# Altium footprint library ICs.PcbLib: 163 footprints (part 6 of 11)
Each footprint in its own frame and in the unit in brackets; x right, y up, seen from the top. Pads: shape width x height; smd on the part's side, far side on the other; paste and mask are expansions set on the pad; w line width, h text height; cw(c..) or ccw(c..) is an arc to the next point about the centre after c.
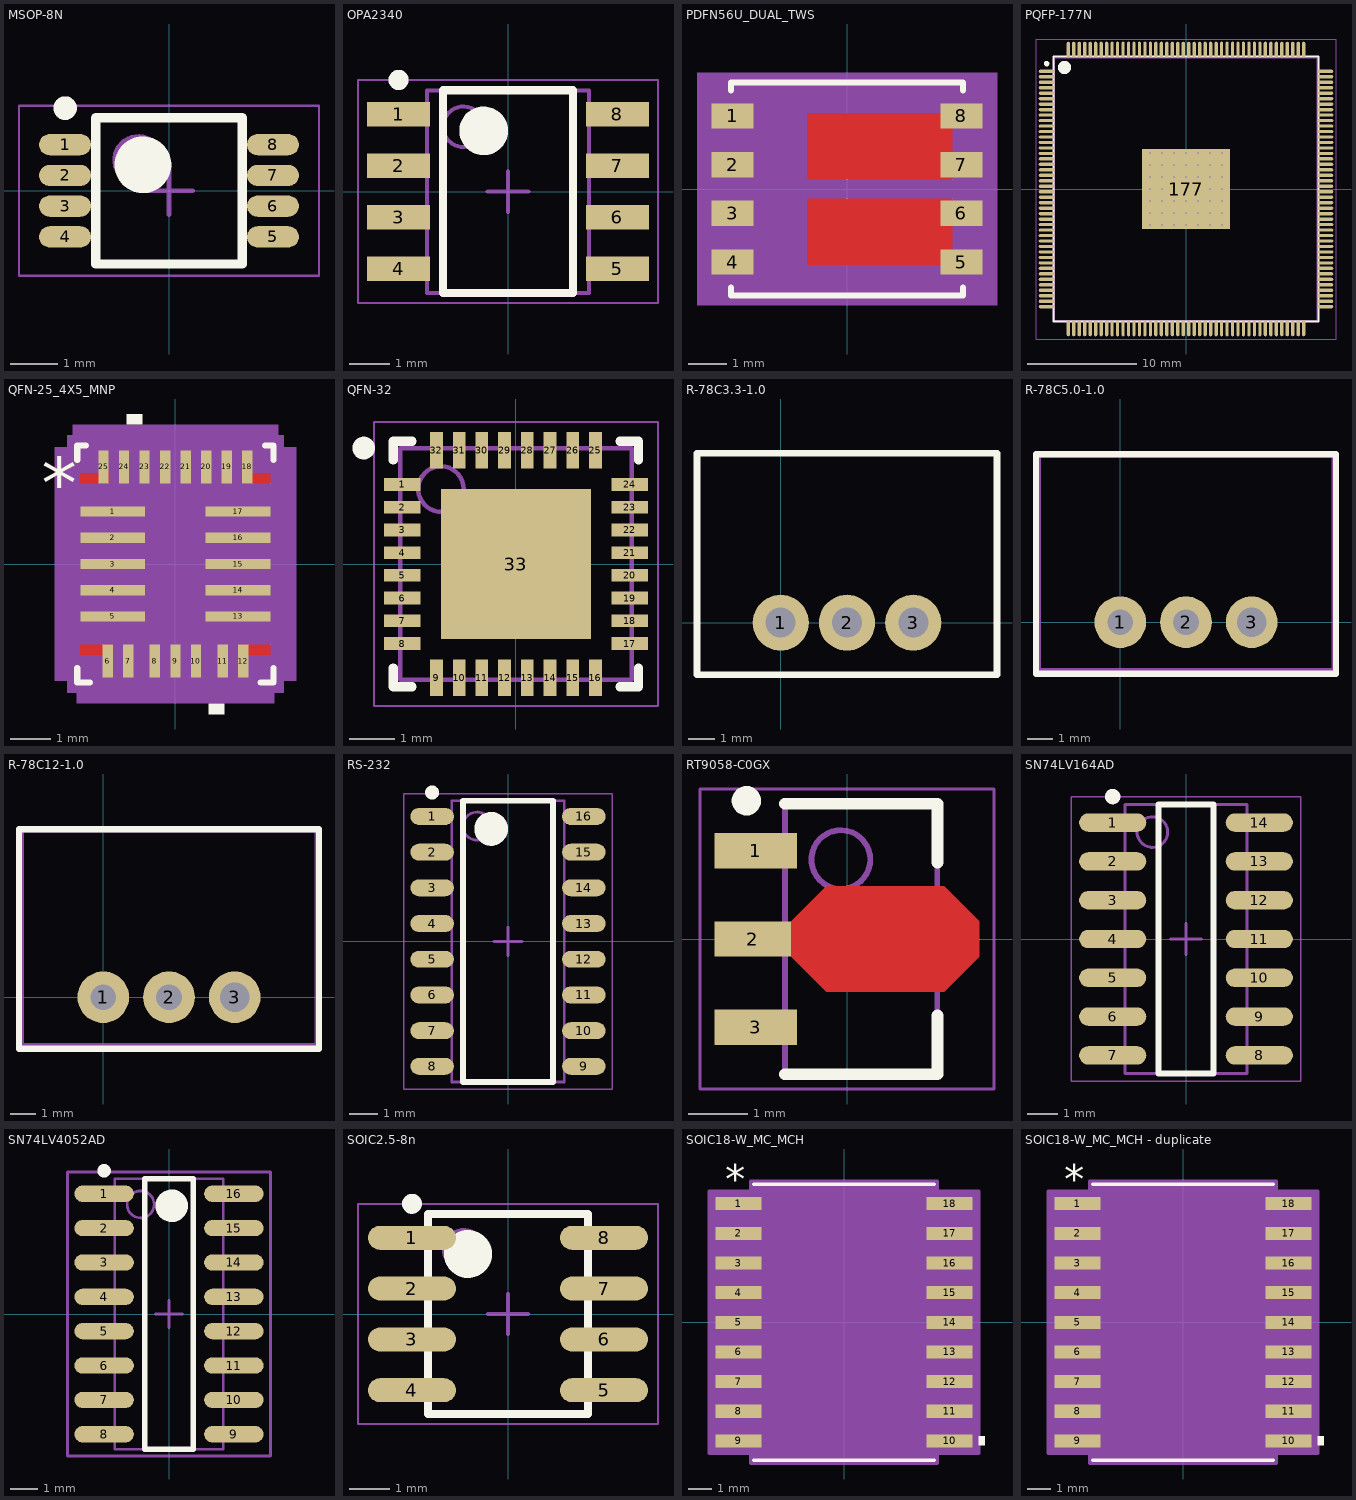
[diagram p5: the footprints below, top view; thin cyan lines are the x and y axes]

## MSOP-8N [mm] "LT1767"
height 1.1
pads (8):
  oval 1.1x0.45 smd: 1(-2.2,0.975) 2(-2.2,0.325) 3(-2.2,-0.325) 4(-2.2,-0.975) 5(2.2,-0.975) 6(2.2,-0.325) 7(2.2,0.325) 8(2.2,0.975)
Top Overlay:
  circle w0.25: c-2.2,1.75 r0.125
  circle w0.6: c-0.55,0.55 r0.3
  lines w0.2: -1.55,-1.55 -1.55,1.55 1.55,1.55 1.55,-1.55 -1.55,-1.55
Mechanical 13:
  circle w0.1: c-0.65,0.65 r0.5
  lines w0.1: -1.55,-1.55 -1.55,1.55 1.55,1.55 1.55,-1.55 -1.55,-1.55
Mechanical 15:
  lines w0.05: -3.175,-1.8 -3.175,1.8 3.175,1.8 3.175,-1.8 -3.175,-1.8
  lines w0.1: -0.5,0 0.5,0 ; 0,-0.5 0,0.5
3D body: height 1.1, standoff 0.1, extent -1.55,-1.55 1.55,1.55

## OPA2340 [mm] "SOIC, 8-Leads, Body 4.90x3.90mm, Pitch 1.27mm, IPC Medium Density"
height 1.75
pads (8):
  rect 1.55x0.6 smd: 1(-2.7,1.905) 2(-2.7,0.635) 3(-2.7,-0.635) 4(-2.7,-1.905) 5(2.7,-1.905) 6(2.7,-0.635) 7(2.7,0.635) 8(2.7,1.905)
Top Overlay:
  circle w0.25: c-2.7,2.755 r0.125
  circle w0.6: c-0.6,1.5 r0.3
  lines w0.2: -1.6,-2.5 -1.6,2.5 1.6,2.5 1.6,-2.5 -1.6,-2.5
Mechanical 13:
  circle w0.1: c-1.1,1.6 r0.5
  lines w0.1: -2,-2.5 -2,2.5 2,2.5 2,-2.5 -2,-2.5
Mechanical 15:
  lines w0.05: -3.7,-2.75 -3.7,2.75 3.7,2.75 3.7,-2.75 -3.7,-2.75
  lines w0.1: -0.5,0 0.5,0 ; 0,-0.5 0,0.5
3D body: height 1.75, standoff 0.25, extent -2,-2.5 2,2.5

## PDFN56U_DUAL_TWS [mil]
pads (8):
  rect 43x26 smd paste+0 mask+0: 1(-117.5,75) 2(-117.5,25) 3(-117.5,-25) 4(-117.5,-75) 5(117.5,-75) 6(117.5,-25) 7(117.5,25) 8(117.5,75)
Top Layer:
  region: 108,10 108,78 -41,78 -41,10
  region: 108,-10 108,-78 -41,-78 -41,-10
Top Overlay:
  lines w6: -119,-101.1 -119,-109.5 119,-109.5 119,-101.1 ; -119,101.1 -119,109.5 119,109.5 119,101.1
Top Paste:
  region: 108,10 108,78 -41,78 -41,10
  region: 108,-10 108,-78 -41,-78 -41,-10
Top Solder:
  region: 108,10 108,78 -41,78 -41,10
  region: 108,-10 108,-78 -41,-78 -41,-10
Mechanical 5:
  region: 154,-119.5 -154,-119.5 -154,119.5 154,119.5
Mechanical 13:
  lines w0: -12,104.5 ccw(c0,104.5) 12,104.5
  lines w1: -114,-104.5 114,-104.5 114,104.5 -114,104.5 -114,-104.5
Mechanical 15:
  region: -124,-102 -149,-102 -149,102 -124,102 -124,114.5 124,114.5 124,102 149,102 149,-102 124,-102 124,-114.5 -124,-114.5
  lines w6: -149,-102 -149,102 -124,102 -124,114.5 124,114.5 124,102 149,102 149,-102 124,-102 124,-114.5 -124,-114.5 -124,-102 -149,-102
3D body "PDFN56U_DUAL_TWS.step": height 43.11, standoff 0, extent -127.01,-104.49 127.01,104.49

## PQFP-177N [mm] "TSQFP, 176-Leads, Body 24.00x24.00mm, Pitch 0.50mm, Thermal Pad 8.07x7.33mm, IPC Medium Density"
height 1.45
pads (177):
  oval 1.45x0.3 smd: 1(-12.725,10.75) 2(-12.725,10.25) 3(-12.725,9.75) 4(-12.725,9.25) 5(-12.725,8.75) 6(-12.725,8.25) 7(-12.725,7.75) 8(-12.725,7.25) 9(-12.725,6.75) 10(-12.725,6.25) 11(-12.725,5.75) 12(-12.725,5.25) 13(-12.725,4.75) 14(-12.725,4.25) 15(-12.725,3.75) 16(-12.725,3.25) 17(-12.725,2.75) 18(-12.725,2.25) 19(-12.725,1.75) 20(-12.725,1.25) 21(-12.725,0.75) 22(-12.725,0.25) 23(-12.725,-0.25) 24(-12.725,-0.75) 25(-12.725,-1.25) 26(-12.725,-1.75) 27(-12.725,-2.25) 28(-12.725,-2.75) 29(-12.725,-3.25) 30(-12.725,-3.75) 31(-12.725,-4.25) 32(-12.725,-4.75) 33(-12.725,-5.25) 34(-12.725,-5.75) 35(-12.725,-6.25) 36(-12.725,-6.75) 37(-12.725,-7.25) 38(-12.725,-7.75) 39(-12.725,-8.25) 40(-12.725,-8.75) 41(-12.725,-9.25) 42(-12.725,-9.75) 43(-12.725,-10.25) 44(-12.725,-10.75) 89(12.725,-10.75) 90(12.725,-10.25) 91(12.725,-9.75) 92(12.725,-9.25) 93(12.725,-8.75) 94(12.725,-8.25) 95(12.725,-7.75) 96(12.725,-7.25) 97(12.725,-6.75) 98(12.725,-6.25) 99(12.725,-5.75) 100(12.725,-5.25) 101(12.725,-4.75) 102(12.725,-4.25) 103(12.725,-3.75) 104(12.725,-3.25) 105(12.725,-2.75) 106(12.725,-2.25) 107(12.725,-1.75) 108(12.725,-1.25) 109(12.725,-0.75) 110(12.725,-0.25) 111(12.725,0.25) 112(12.725,0.75) 113(12.725,1.25) 114(12.725,1.75) 115(12.725,2.25) 116(12.725,2.75) 117(12.725,3.25) 118(12.725,3.75) 119(12.725,4.25) 120(12.725,4.75) 121(12.725,5.25) 122(12.725,5.75) 123(12.725,6.25) 124(12.725,6.75) 125(12.725,7.25) 126(12.725,7.75) 127(12.725,8.25) 128(12.725,8.75) 129(12.725,9.25) 130(12.725,9.75) 131(12.725,10.25) 132(12.725,10.75)
  oval 0.3x1.45 smd: 45(-10.75,-12.725) 46(-10.25,-12.725) 47(-9.75,-12.725) 48(-9.25,-12.725) 49(-8.75,-12.725) 50(-8.25,-12.725) 51(-7.75,-12.725) 52(-7.25,-12.725) 53(-6.75,-12.725) 54(-6.25,-12.725) 55(-5.75,-12.725) 56(-5.25,-12.725) 57(-4.75,-12.725) 58(-4.25,-12.725) 59(-3.75,-12.725) 60(-3.25,-12.725) 61(-2.75,-12.725) 62(-2.25,-12.725) 63(-1.75,-12.725) 64(-1.25,-12.725) 65(-0.75,-12.725) 66(-0.25,-12.725) 67(0.25,-12.725) 68(0.75,-12.725) 69(1.25,-12.725) 70(1.75,-12.725) 71(2.25,-12.725) 72(2.75,-12.725) 73(3.25,-12.725) 74(3.75,-12.725) 75(4.25,-12.725) 76(4.75,-12.725) 77(5.25,-12.725) 78(5.75,-12.725) 79(6.25,-12.725) 80(6.75,-12.725) 81(7.25,-12.725) 82(7.75,-12.725) 83(8.25,-12.725) 84(8.75,-12.725) 85(9.25,-12.725) 86(9.75,-12.725) 87(10.25,-12.725) 88(10.75,-12.725) 133(10.75,12.725) 134(10.25,12.725) 135(9.75,12.725) 136(9.25,12.725) 137(8.75,12.725) 138(8.25,12.725) 139(7.75,12.725) 140(7.25,12.725) 141(6.75,12.725) 142(6.25,12.725) 143(5.75,12.725) 144(5.25,12.725) 145(4.75,12.725) 146(4.25,12.725) 147(3.75,12.725) 148(3.25,12.725) 149(2.75,12.725) 150(2.25,12.725) 151(1.75,12.725) 152(1.25,12.725) 153(0.75,12.725) 154(0.25,12.725) 155(-0.25,12.725) 156(-0.75,12.725) 157(-1.25,12.725) 158(-1.75,12.725) 159(-2.25,12.725) 160(-2.75,12.725) 161(-3.25,12.725) 162(-3.75,12.725) 163(-4.25,12.725) 164(-4.75,12.725) 165(-5.25,12.725) 166(-5.75,12.725) 167(-6.25,12.725) 168(-6.75,12.725) 169(-7.25,12.725) 170(-7.75,12.725) 171(-8.25,12.725) 172(-8.75,12.725) 173(-9.25,12.725) 174(-9.75,12.725) 175(-10.25,12.725) 176(-10.75,12.725)
  rect 8.07x7.33 smd: 177(0,0)
via 3.3,-3.3 diameter 0.5 hole 0.2
via 2.2,-3.3 diameter 0.5 hole 0.2
via 1.1,-3.3 diameter 0.5 hole 0.2
via 0,-3.3 diameter 0.5 hole 0.2
via -1.1,-3.3 diameter 0.5 hole 0.2
via -2.2,-3.3 diameter 0.5 hole 0.2
via -3.3,-3.3 diameter 0.5 hole 0.2
via 3.3,-2.2 diameter 0.5 hole 0.2
via 2.2,-2.2 diameter 0.5 hole 0.2
via 1.1,-2.2 diameter 0.5 hole 0.2
via 0,-2.2 diameter 0.5 hole 0.2
via -1.1,-2.2 diameter 0.5 hole 0.2
via -2.2,-2.2 diameter 0.5 hole 0.2
via -3.3,-2.2 diameter 0.5 hole 0.2
via 3.3,-1.1 diameter 0.5 hole 0.2
via 2.2,-1.1 diameter 0.5 hole 0.2
via 1.1,-1.1 diameter 0.5 hole 0.2
via 0,-1.1 diameter 0.5 hole 0.2
via -1.1,-1.1 diameter 0.5 hole 0.2
via -2.2,-1.1 diameter 0.5 hole 0.2
via -3.3,-1.1 diameter 0.5 hole 0.2
via 3.3,0 diameter 0.5 hole 0.2
via 2.2,0 diameter 0.5 hole 0.2
via 1.1,0 diameter 0.5 hole 0.2
via 0,0 diameter 0.5 hole 0.2
via -1.1,0 diameter 0.5 hole 0.2
via -2.2,0 diameter 0.5 hole 0.2
via -3.3,0 diameter 0.5 hole 0.2
via 3.3,1.1 diameter 0.5 hole 0.2
via 2.2,1.1 diameter 0.5 hole 0.2
via 1.1,1.1 diameter 0.5 hole 0.2
via 0,1.1 diameter 0.5 hole 0.2
via -1.1,1.1 diameter 0.5 hole 0.2
via -2.2,1.1 diameter 0.5 hole 0.2
via -3.3,1.1 diameter 0.5 hole 0.2
via 3.3,2.2 diameter 0.5 hole 0.2
via 2.2,2.2 diameter 0.5 hole 0.2
via 1.1,2.2 diameter 0.5 hole 0.2
via 0,2.2 diameter 0.5 hole 0.2
via -1.1,2.2 diameter 0.5 hole 0.2
via -2.2,2.2 diameter 0.5 hole 0.2
via -3.3,2.2 diameter 0.5 hole 0.2
via 3.3,3.3 diameter 0.5 hole 0.2
via 2.2,3.3 diameter 0.5 hole 0.2
via 1.1,3.3 diameter 0.5 hole 0.2
via 0,3.3 diameter 0.5 hole 0.2
via -1.1,3.3 diameter 0.5 hole 0.2
via -2.2,3.3 diameter 0.5 hole 0.2
via -3.3,3.3 diameter 0.5 hole 0.2
Top Overlay:
  circle w0.6: c-11.1,11.1 r0.3
  circle w0.25: c-12.725,11.45 r0.125
  lines w0.2: -12.1,-12.1 12.1,-12.1 12.1,12.1 -12.1,12.1 -12.1,-12.1
Mechanical 13:
  circle w0.1: c-11.1,11.1 r0.5
  lines w0.1: -12,-12 12,-12 12,12 -12,12 -12,-12
Mechanical 15:
  lines w0.05: -13.7,-13.7 13.7,-13.7 13.7,13.7 -13.7,13.7 -13.7,-13.7
  lines w0.1: -0.5,0 0.5,0 ; 0,-0.5 0,0.5
3D body: height 1.45, standoff 0.25, extent -12,-12 12,12

## QFN-25_4X5_MNP [mil]
pads (25):
  rect 63x10 smd paste-5 mask+0: 1(-61,51) 2(-61,25.5) 3(-61,0) 4(-61,-25.5) 5(-61,-51) 13(61,-51) 14(61,-25.5) 15(61,0) 16(61,25.5) 17(61,51)
  rect 10x32 smd paste+0 mask+0: 6(-66,-94.5) 7(-46,-94.5) 8(-20,-94.5) 9(0,-94.5) 10(20,-94.5) 11(46,-94.5) 12(66,-94.5) 18(70,94.5) 19(50,94.5) 20(30,94.5) 21(10,94.5) 22(-10,94.5) 23(-30,94.5) 24(-50,94.5) 25(-70,94.5)
Top Layer:
  region: -61,-88.5 -61,-78.5 -92.5,-78.5 -92.5,-88.5
  region: 61,-88.5 61,-78.5 92.5,-78.5 92.5,-88.5
  region: 65,88.5 65,78.5 92.5,78.5 92.5,88.5
  region: -65,88.5 -65,78.5 -92.5,78.5 -92.5,88.5
Top Overlay:
  region: -32.5,136 -47.5,136 -47.5,146 -32.5,146
  region: 47.5,-136 32.5,-136 32.5,-146 47.5,-146
  lines w6: -95.5,-101.25 -95.5,-115.5 -83.11,-115.5 ; -95.5,101.25 -95.5,115.5 -87.11,115.5 ; 83.11,-115.5 95.5,-115.5 95.5,-101.25 ; 87.11,115.5 95.5,115.5 95.5,101.25
  text "*" at -130,53.75 h50
Top Paste:
  region: 65,88.5 65,78.5 92.5,78.5 92.5,88.5
  region: -65,88.5 -65,78.5 -92.5,78.5 -92.5,88.5
  region: -61,-88.5 -61,-78.5 -92.5,-78.5 -92.5,-88.5
  region: 61,-88.5 61,-78.5 92.5,-78.5 92.5,-88.5
Top Solder:
  region: -61,-88.5 -61,-78.5 -92.5,-78.5 -92.5,-88.5
  region: 61,-88.5 61,-78.5 92.5,-78.5 92.5,-88.5
  region: 65,88.5 65,78.5 92.5,78.5 92.5,88.5
  region: -65,88.5 -65,78.5 -92.5,78.5 -92.5,88.5
Mechanical 5:
  region: -105.5,-125.5 -96,-125.5 -96,-135.5 96,-135.5 96,-125.5 105.5,-125.5 105.5,-113.5 117.5,-113.5 117.5,113.5 105.5,113.5 105.5,125.5 100,125.5 100,135.5 -100,135.5 -100,125.5 -105.5,125.5 -105.5,113.5 -117.5,113.5 -117.5,-113.5 -105.5,-113.5
Mechanical 13:
  lines w1: -80.5,50.5 -30.5,100.5 ; -80.5,-100.5 -80.5,100.5 80.5,100.5 80.5,-100.5 -80.5,-100.5
  text "*" at -32,38.75 h50
Mechanical 15:
  region: -90.5,-110.5 -81,-110.5 -81,-120.5 81,-120.5 81,-110.5 90.5,-110.5 90.5,-98.5 102.5,-98.5 102.5,-68.5 90.5,-68.5 90.5,-66 102.5,-66 102.5,66 90.5,66 90.5,68.5 102.5,68.5 102.5,98.5 90.5,98.5 90.5,110.5 85,110.5 85,120.5 -85,120.5 -85,110.5 -90.5,110.5 -90.5,98.5 -102.5,98.5 -102.5,68.5 -90.5,68.5 -90.5,66 -102.5,66 -102.5,-66 -90.5,-66 -90.5,-68.5 -102.5,-68.5 -102.5,-98.5 -90.5,-98.5
  lines w6: -102.5,-98.5 -90.5,-98.5 -90.5,-110.5 -81,-110.5 -81,-120.5 81,-120.5 81,-110.5 90.5,-110.5 90.5,-98.5 102.5,-98.5 102.5,-68.5 90.5,-68.5 90.5,-66 102.5,-66 102.5,66 90.5,66 90.5,68.5 102.5,68.5 102.5,98.5 90.5,98.5 90.5,110.5 85,110.5 85,120.5 -85,120.5 -85,110.5 -90.5,110.5 -90.5,98.5 -102.5,98.5 -102.5,68.5 -90.5,68.5 -90.5,66 -102.5,66 -102.5,-66 -90.5,-66 -90.5,-68.5 -102.5,-68.5 -102.5,-98.5
3D body: height 10, standoff 0, extent -5,-5 5,5

## QFN-32 [mm] "QFN, 32-Leads, Body 5.00x5.00mm, Pitch 0.50mm, Thermal Pad 3.30x3.30mm, IPC Medium Density"
height 1
pads (33):
  rect 0.8x0.28 smd: 1(-2.5,1.75) 2(-2.5,1.25) 3(-2.5,0.75) 4(-2.5,0.25) 5(-2.5,-0.25) 6(-2.5,-0.75) 7(-2.5,-1.25) 8(-2.5,-1.75) 17(2.5,-1.75) 18(2.5,-1.25) 19(2.5,-0.75) 20(2.5,-0.25) 21(2.5,0.25) 22(2.5,0.75) 23(2.5,1.25) 24(2.5,1.75)
  rect 0.28x0.8 smd: 9(-1.75,-2.5) 10(-1.25,-2.5) 11(-0.75,-2.5) 12(-0.25,-2.5) 13(0.25,-2.5) 14(0.75,-2.5) 15(1.25,-2.5) 16(1.75,-2.5) 25(1.75,2.5) 26(1.25,2.5) 27(0.75,2.5) 28(0.25,2.5) 29(-0.25,2.5) 30(-0.75,2.5) 31(-1.25,2.5) 32(-1.75,2.5)
  rect 3.3x3.3 smd: 33(0,0)
Top Overlay:
  circle w0.25: c-3.35,2.55 r0.125
  lines w0.2: -2.7,-2.29 -2.7,-2.7 -2.29,-2.7 ; -2.7,2.29 -2.7,2.7 -2.29,2.7 ; 2.29,-2.7 2.7,-2.7 2.7,-2.29 ; 2.29,2.7 2.7,2.7 2.7,2.29
Mechanical 13:
  circle w0.1: c-1.65,1.65 r0.5
  lines w0.1: -2.55,-2.55 -2.55,2.55 2.55,2.55 2.55,-2.55 -2.55,-2.55
Mechanical 15:
  lines w0.05: -3.125,-3.125 -3.125,3.125 3.125,3.125 3.125,-3.125 -3.125,-3.125
  lines w0.1: -0.5,0 0.5,0 ; 0,-0.5 0,0.5
3D body: height 1, standoff 0, extent -2.55,-2.55 2.55,2.55
3D body: height 1.22, standoff 0, extent -2.616,-2.591 2.591,2.616

## R-78C3.3-1.0 [mm] "CONV DC/DC 1A 3.3V OUT SIP VERT"
height 10.4
pads (3):
  round 2.15 hole 1.15: 1(0,0) 2(2.54,0) 3(5.08,0)
Top Overlay:
  lines w0.25: -3.21,-2 8.29,-2 8.29,6.5 -3.21,6.5 -3.21,-2
3D body: height 10.4, standoff 0, extent -3.302,-2.032 8.382,6.604

## R-78C5.0-1.0 [mm] "CONV DC/DC 1A 5V OUT SIP VERT"
height 10.5
pads (3):
  round 2 hole 1: 1(0,0) 2(2.54,0)
  round 2 hole 1.15: 3(5.08,0)
Top Overlay:
  lines w0.25: -3.26,-2 -3.26,6.5 8.34,6.5 8.34,-2 -3.26,-2
Mechanical 15:
  lines w0.25: -3.2,6.5 -3.2,-1.9 8.2,-1.9 8.3,-2 8.3,6.5 ; -3.2,6.5 8.3,6.5 ; -3.2,6.5 -0.2,6.5 -3.2,6.5 ; -3.2,6.5 8.3,6.5 ; -3.2,6.5 8.3,6.5
3D body: height 10.8, standoff 0, extent -3.2,-1.9 8.3,6.5

## R-78C12-1.0 [mm] "CONV DC/DC 1A 12V OUT SIP VERT"
height 10.5
pads (3):
  round 2 hole 1: 1(0,0) 2(2.54,0)
  round 2 hole 1.15: 3(5.08,0)
Top Overlay:
  lines w0.25: -3.26,-2 -3.26,6.5 8.34,6.5 8.34,-2 -3.26,-2
Mechanical 15:
  lines w0.25: -3.2,6.5 -3.2,-1.9 8.2,-1.9 8.3,-2 8.3,6.5 ; -3.2,6.5 8.3,6.5 ; -3.2,6.5 -0.2,6.5 -3.2,6.5 ; -3.2,6.5 8.3,6.5 ; -3.2,6.5 8.3,6.5
3D body: height 10.8, standoff 0, extent -3.2,-1.9 8.3,6.5

## RS-232 [mm] "IC DVR/RCVR RS232 DUAL 16SOIC"
height 1.75
pads (16):
  oval 1.55x0.6 smd: 1(-2.7,4.445) 2(-2.7,3.175) 3(-2.7,1.905) 4(-2.7,0.635) 5(-2.7,-0.635) 6(-2.7,-1.905) 7(-2.7,-3.175) 8(-2.7,-4.445) 9(2.7,-4.445) 10(2.7,-3.175) 11(2.7,-1.905) 12(2.7,-0.635) 13(2.7,0.635) 14(2.7,1.905) 15(2.7,3.175) 16(2.7,4.445)
Top Overlay:
  circle w0.25: c-2.7,5.295 r0.125
  circle w0.6: c-0.6,4 r0.3
  lines w0.2: -1.6,-5 -1.6,5 1.6,5 1.6,-5 -1.6,-5
Mechanical 13:
  circle w0.1: c-1.1,4.1 r0.5
  lines w0.1: -2,-5 -2,5 2,5 2,-5 -2,-5
Mechanical 15:
  lines w0.05: -3.7,-5.25 -3.7,5.25 3.7,5.25 3.7,-5.25 -3.7,-5.25
  lines w0.1: -0.5,0 0.5,0 ; 0,-0.5 0,0.5
3D body: height 1.75, standoff 0.1, extent -2,-5 2,5

## RT9058-C0GX [mm]
height 1.6
pads (3):
  rect 1.4x0.6 smd: 1(-1.55,1.5) 3(-1.55,-1.5)
  rect 1.3x0.6 smd: 2(-1.6,0)
Top Layer:
  region: -0.95,0.3 -0.35,0.9 1.65,0.9 2.25,0.3 2.25,-0.3 1.65,-0.9 -0.35,-0.9 -0.95,-0.3
Top Overlay:
  circle w0.25: c-1.71,2.35 r0.125
  lines w0.2: -1.06,-2.3 1.54,-2.3 1.54,-1.3 ; -1.06,2.3 1.54,2.3 1.54,1.3
Mechanical 13:
  circle w0.1: c-0.105,1.35 r0.5
  lines w0.1: -1.055,-2.3 1.535,-2.3 1.535,2.3 -1.055,2.3 -1.055,-2.3
Mechanical 15:
  lines w0.05: -2.5,-2.55 2.5,-2.55 2.5,2.55 -2.5,2.55 -2.5,-2.55
  lines w0.1: -0.26,0 0.74,0 ; 0.24,-0.5 0.24,0.5
3D body: height 1.6, standoff 0, extent -1.055,-2.3 1.535,2.3

## SN74LV164AD [mm] "SOIC, 14-Leads, Body 8.65x3.90mm, Pitch 1.27mm, IPC Medium Density"
height 1.75
pads (14):
  oval 2.2x0.6 smd: 1(-2.4,3.81) 2(-2.4,2.54) 3(-2.4,1.27) 4(-2.4,0) 5(-2.4,-1.27) 6(-2.4,-2.54) 7(-2.4,-3.81) 8(2.4,-3.81) 9(2.4,-2.54) 10(2.4,-1.27) 11(2.4,0) 12(2.4,1.27) 13(2.4,2.54) 14(2.4,3.81)
Top Overlay:
  circle w0.25: c-2.4,4.66 r0.125
  lines w0.2: -0.9,-4.4 -0.9,4.4 0.9,4.4 0.9,-4.4 -0.9,-4.4
Mechanical 13:
  circle w0.1: c-1.1,3.5 r0.5
  lines w0.1: -2,-4.4 -2,4.4 2,4.4 2,-4.4 -2,-4.4
Mechanical 15:
  lines w0.05: -3.75,-4.65 -3.75,4.65 3.75,4.65 3.75,-4.65 -3.75,-4.65
  lines w0.1: -0.5,0 0.5,0 ; 0,-0.5 0,0.5
3D body: height 1.75, standoff 0.1, extent -2,-4.4 2,4.4

## SN74LV4052AD [mm] "SOIC, 16-Leads, Body 10.0x4.0mm (max), Pitch 1.27mm, IPC Medium Density"
height 1.75
pads (16):
  oval 2.2x0.6 smd mask+0.07: 1(-2.4,4.445) 2(-2.4,3.175) 3(-2.4,1.905) 4(-2.4,0.635) 5(-2.4,-0.635) 6(-2.4,-1.905) 7(-2.4,-3.175) 8(-2.4,-4.445) 9(2.4,-4.445) 10(2.4,-3.175) 11(2.4,-1.905) 12(2.4,-0.635) 13(2.4,0.635) 14(2.4,1.905) 15(2.4,3.175) 16(2.4,4.445)
Top Overlay:
  circle w0.25: c-2.4,5.295 r0.125
  circle w0.6: c0.1,4 r0.3
  lines w0.2: -0.9,-5 -0.9,5 0.9,5 0.9,-5 -0.9,-5
Mechanical 13:
  circle w0.1: c-1.05,4.05 r0.5
  lines w0.1: -2,-5 -2,5 2,5 2,-5 -2,-5
Mechanical 15:
  lines w0.1: -0.5,0 0.5,0 ; 0,-0.5 0,0.5 ; -3.75,-5.25 -3.75,5.25 3.75,5.25 3.75,-5.25 -3.75,-5.25
3D body: height 1.75, standoff 0.1, extent -2,-5 2,5

## SOIC2.5-8n [mm] "For 2.5V ref IC"
height 1.75
pads (8):
  oval 2.2x0.6 smd: 1(-2.4,1.905) 2(-2.4,0.635) 3(-2.4,-0.635) 4(-2.4,-1.905) 5(2.4,-1.905) 6(2.4,-0.635) 7(2.4,0.635) 8(2.4,1.905)
Top Overlay:
  circle w0.6: c-1,1.5 r0.3
  circle w0.25: c-2.4,2.755 r0.125
  lines w0.2: -2,-2.5 2,-2.5 2,2.5 -2,2.5 -2,-2.5
Mechanical 13:
  circle w0.1: c-1.1,1.6 r0.5
  lines w0.1: -2,-2.5 2,-2.5 2,2.5 -2,2.5 -2,-2.5
Mechanical 15:
  lines w0.05: -3.75,-2.75 3.75,-2.75 3.75,2.75 -3.75,2.75 -3.75,-2.75
  lines w0.1: -0.5,0 0.5,0 ; 0,-0.5 0,0.5
3D body: height 1.75, standoff 0.1, extent -2,-2.5 2,2.5

## SOIC18-W_MC_MCH [mil]
pads (18):
  rect 78x22 smd paste+0 mask+0: 1(-178,200) 2(-178,150) 3(-178,100) 4(-178,50) 5(-178,0) 6(-178,-50) 7(-178,-100) 8(-178,-150) 9(-178,-200) 10(178,-200) 11(178,-150) 12(178,-100) 13(178,-50) 14(178,0) 15(178,50) 16(178,100) 17(178,150) 18(178,200)
Top Overlay:
  region: 227,-192.5 237,-192.5 237,-207.5 227,-207.5
  lines w6: -152.5,-232.5 152.5,-232.5 ; -152.5,232.5 152.5,232.5
  text "*" at -200.5,217 h50
Mechanical 13:
  lines w0: -12,227.5 ccw(c0,227.5) 12,227.5
  lines w1: -203,-210 -203,-190 -147.5,-190 -147.5,-210 -203,-210 ; -203,-160 -203,-140 -147.5,-140 -147.5,-160 -203,-160 ; -203,-110 -203,-90 -147.5,-90 -147.5,-110 -203,-110 ; -203,-60 -203,-40 -147.5,-40 -147.5,-60 -203,-60 ; -203,-10 -203,10 -147.5,10 -147.5,-10 -203,-10 ; -203,40 -203,60 -147.5,60 -147.5,40 -203,40 ; -203,90 -203,110 -147.5,110 -147.5,90 -203,90 ; -203,140 -203,160 -147.5,160 -147.5,140 -203,140 ; -203,190 -203,210 -147.5,210 -147.5,190 -203,190 ; -147.5,-227.5 147.5,-227.5 147.5,227.5 -147.5,227.5 -147.5,-227.5 ; 147.5,-210 147.5,-190 203,-190 203,-210 147.5,-210 ; 147.5,-160 147.5,-140 203,-140 203,-160 147.5,-160 ; 147.5,-110 147.5,-90 203,-90 203,-110 147.5,-110 ; 147.5,-60 147.5,-40 203,-40 203,-60 147.5,-60 ; 147.5,-10 147.5,10 203,10 203,-10 147.5,-10 ; 147.5,40 147.5,60 203,60 203,40 147.5,40 ; 147.5,90 147.5,110 203,110 203,90 147.5,90 ; 147.5,140 147.5,160 203,160 203,140 147.5,140 ; 147.5,190 147.5,210 203,210 203,190 147.5,190
  text "*" at -145,174.5 h50
Mechanical 15:
  region: -157.5,-221 -227,-221 -227,221 -157.5,221 -157.5,237.5 157.5,237.5 157.5,221 227,221 227,-221 157.5,-221 157.5,-237.5 -157.5,-237.5
  lines w6: -227,-221 -227,221 -157.5,221 -157.5,237.5 157.5,237.5 157.5,221 227,221 227,-221 157.5,-221 157.5,-237.5 -157.5,-237.5 -157.5,-221 -227,-221
3D body "SOIC18-W_MC_MCH.step": height 104.09, standoff 0, extent -202.99,-227.48 202.99,227.48

## SOIC18-W_MC_MCH - duplicate [mil]
pads (18):
  rect 78x22 smd paste+0 mask+0: 1(-178,200) 2(-178,150) 3(-178,100) 4(-178,50) 5(-178,0) 6(-178,-50) 7(-178,-100) 8(-178,-150) 9(-178,-200) 10(178,-200) 11(178,-150) 12(178,-100) 13(178,-50) 14(178,0) 15(178,50) 16(178,100) 17(178,150) 18(178,200)
Top Overlay:
  region: 227,-192.5 237,-192.5 237,-207.5 227,-207.5
  lines w6: -152.5,-232.5 152.5,-232.5 ; -152.5,232.5 152.5,232.5
  text "*" at -200.5,217 h50
Mechanical 13:
  lines w0: -12,227.5 ccw(c0,227.5) 12,227.5
  lines w1: -203,-210 -147.5,-210 -147.5,-190 -203,-190 -203,-210 ; -203,-160 -147.5,-160 -147.5,-140 -203,-140 -203,-160 ; -203,-110 -147.5,-110 -147.5,-90 -203,-90 -203,-110 ; -203,-60 -147.5,-60 -147.5,-40 -203,-40 -203,-60 ; -203,-10 -147.5,-10 -147.5,10 -203,10 -203,-10 ; -203,40 -147.5,40 -147.5,60 -203,60 -203,40 ; -203,90 -147.5,90 -147.5,110 -203,110 -203,90 ; -203,140 -147.5,140 -147.5,160 -203,160 -203,140 ; -203,190 -147.5,190 -147.5,210 -203,210 -203,190 ; -147.5,-227.5 -147.5,227.5 147.5,227.5 147.5,-227.5 -147.5,-227.5 ; 147.5,-210 203,-210 203,-190 147.5,-190 147.5,-210 ; 147.5,-160 203,-160 203,-140 147.5,-140 147.5,-160 ; 147.5,-110 203,-110 203,-90 147.5,-90 147.5,-110 ; 147.5,-60 203,-60 203,-40 147.5,-40 147.5,-60 ; 147.5,-10 203,-10 203,10 147.5,10 147.5,-10 ; 147.5,40 203,40 203,60 147.5,60 147.5,40 ; 147.5,90 203,90 203,110 147.5,110 147.5,90 ; 147.5,140 203,140 203,160 147.5,160 147.5,140 ; 147.5,190 203,190 203,210 147.5,210 147.5,190
  text "*" at -145,174.5 h50
Mechanical 15:
  region: -157.5,-221 -227,-221 -227,221 -157.5,221 -157.5,237.5 157.5,237.5 157.5,221 227,221 227,-221 157.5,-221 157.5,-237.5 -157.5,-237.5
  lines w6: -227,-221 -157.5,-221 -157.5,-237.5 157.5,-237.5 157.5,-221 227,-221 227,221 157.5,221 157.5,237.5 -157.5,237.5 -157.5,221 -227,221 -227,-221
3D body "SOIC18-W_MC_MCH.step": height 104.09, standoff 0, extent -202.99,-227.48 202.99,227.48